# Altium footprint library USER_Lib.PcbLib: 109 footprints (part 4 of 7)
Each footprint in its own frame and in the unit in brackets; x right, y up, seen from the top. Pads: shape width x height; smd on the part's side, far side on the other; paste and mask are expansions set on the pad; w line width, h text height; cw(c..) or ccw(c..) is an arc to the next point about the centre after c.
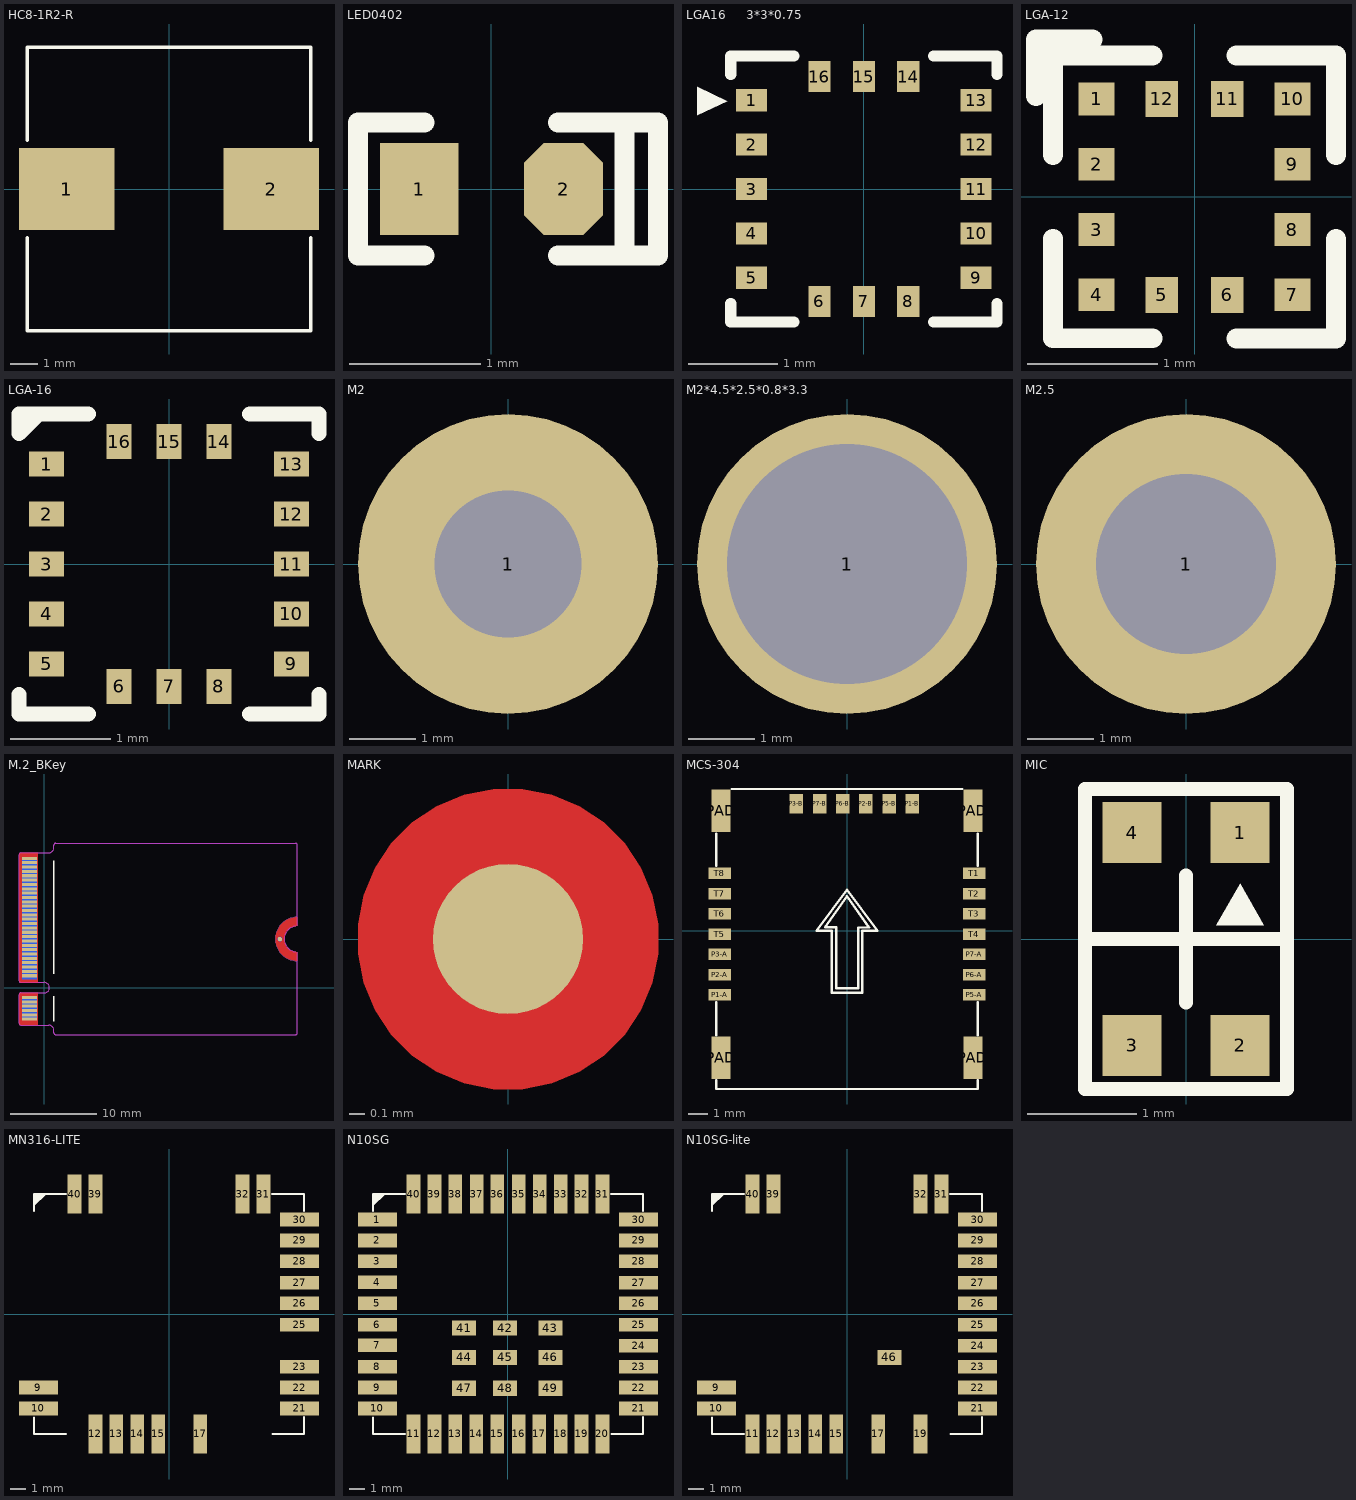
[diagram p3: the footprints below, top view; thin cyan lines are the x and y axes]

## HC8-1R2-R [mm] "1.2uH电感"
pads (2):
  rect 3.5x3 smd mask+0.102: 1(-3.75,0) 2(3.75,0)
Top Overlay:
  lines w0.127: -5.2,-1.778 -5.2,-5.2 0,-5.2 5.2,-5.2 5.2,-1.778 ; -5.2,1.778 -5.2,5.2 0,5.2 5.2,5.2 5.2,1.778
3D body "HC8-1R2-R.STEP": height 4, standoff 0, extent -5.45,-5.2 5.45,5.2

## IPEX 1代 [mm]

## LED0402 [mm] "0402贴片灯珠"
pads (2):
  rect 0.6x0.7 smd: 1(-0.55,0)
  oct 0.6x0.7 smd: 2(0.55,0)
Top Overlay:
  lines w0.152: -0.508,-0.508 -1.016,-0.508 -1.016,0.508 -0.508,0.508 ; 0.508,-0.508 1.27,-0.508 1.27,0.508 0.508,0.508 ; 1.016,-0.508 1.016,0.508
3D body "0402SMD_LED.STEP": height 0.45, standoff 0, extent -0.5,-0.25 0.5,0.25

## LGA16     3*3*0.75 [mm]
pads (16):
  rect 0.35x0.25 smd: 1(-1.265,1) 2(-1.265,0.5) 3(-1.265,0) 4(-1.265,-0.5) 5(-1.265,-1) 9(1.265,-1) 10(1.265,-0.5) 11(1.265,0) 12(1.265,0.5) 13(1.265,1)
  rect 0.25x0.35 smd: 6(-0.5,-1.265) 7(0,-1.265) 8(0.5,-1.265) 14(0.5,1.265) 15(0,1.265) 16(-0.5,1.265)
Top Overlay:
  region: -1.88,1.152 -1.537,0.991 -1.88,0.829
  lines w0.127: -1.5,-1.291 -1.5,-1.499 -0.787,-1.499 ; -1.5,1.291 -1.5,1.499 -0.787,1.499 ; 0.787,-1.499 1.5,-1.499 1.5,-1.291 ; 0.787,1.499 1.5,1.499 1.5,1.291
3D body "LGA16_3x3x0.75mm.STEP": height 0.75, standoff 0, extent -1.5,-1.5 1.5,1.5

## LGA-12 [mm] "KXTJ-1057"
pads (12):
  rect 0.275x0.25 smd: 1(-0.75,0.75) 2(-0.75,0.25) 3(-0.75,-0.25) 4(-0.75,-0.75) 7(0.75,-0.75) 8(0.75,-0.25) 9(0.75,0.25) 10(0.75,0.75)
  rect 0.25x0.275 smd: 5(-0.25,-0.75) 6(0.25,-0.75) 11(0.25,0.75) 12(-0.25,0.75)
Top Overlay:
  lines w0.152: -1.214,0.773 -1.214,1.205 -0.782,1.205 ; -1.084,-0.32 -1.084,-1.082 -0.322,-1.082 ; -1.082,0.322 -1.082,1.084 -0.32,1.084 ; 0.32,-1.084 1.082,-1.084 1.082,-0.322 ; 0.322,1.082 1.084,1.082 1.084,0.32
3D body "LGA-12.STEP": height 0.9, standoff 0, extent -1,-1 1,1

## LGA-16 [mm] "ICM20602"
pads (16):
  rect 0.35x0.25 smd: 1(-1.225,1) 2(-1.225,0.5) 3(-1.225,0) 4(-1.225,-0.5) 5(-1.225,-1) 9(1.225,-1) 10(1.225,-0.5) 11(1.225,0) 12(1.225,0.5) 13(1.225,1)
  rect 0.25x0.35 smd: 6(-0.5,-1.225) 7(0,-1.225) 8(0.5,-1.225) 14(0.5,1.225) 15(0,1.225) 16(-0.5,1.225)
Top Overlay:
  lines w0.152: -1.5,-1.306 -1.5,-1.5 -0.807,-1.5 ; -0.807,1.5 -1.5,1.5 ; 0.807,-1.5 1.5,-1.5 1.5,-1.306 ; 0.807,1.5 1.5,1.5 1.5,1.306 ; -1.5,1.5 -1.5,1.306 -1.306,1.5 -1.5,1.5
3D body "ICM20602.STEP": height 0.75, standoff 0, extent -1.5,-1.5 1.5,1.5

## M2 [mm]
pads (1):
  round 4.5 hole 2.2: 1(0,0)

## M2*4.5*2.5*0.8*3.3 [mm] "SMT螺母"
pads (1):
  round 4.5 hole 3.6: 1(0,0)
3D body "M2x4.5x2.5x0.8x3.STEP": height 2.5, standoff -0.8, extent -2.25,-2.25 2.25,2.25

## M2.5 [mm]
pads (1):
  round 4.5 hole 2.7: 1(0,0)

## M.2_BKey [mm]
pads (69):
  round 0.5 smd: 0(27.102,5.588)
  round 0.5 smd far side: 0(27.102,5.588)
  rect 1.7x0.35 smd: 1(-1.7,-3.625) 3(-1.7,-3.125) 5(-1.7,-2.625) 7(-1.7,-2.125) 9(-1.7,-1.625) 11(-1.7,-1.125) 21(-1.7,1.375) 23(-1.7,1.875) 25(-1.7,2.375) 27(-1.7,2.875) 29(-1.7,3.375) 31(-1.7,3.875) 33(-1.7,4.375) 35(-1.7,4.875) 37(-1.7,5.375) 39(-1.7,5.875) 41(-1.7,6.375) 43(-1.7,6.875) 45(-1.7,7.375) 47(-1.7,7.875) 49(-1.7,8.375) 51(-1.7,8.875) 53(-1.7,9.375) 55(-1.7,9.875) 57(-1.7,10.375) 59(-1.7,10.875) 61(-1.7,11.375) 63(-1.7,11.875) 65(-1.7,12.375) 67(-1.7,12.875) 69(-1.7,13.375) 71(-1.7,13.875) 73(-1.7,14.375) 75(-1.7,14.875)
  rect 1.7x0.35 smd far side: 2(-1.7,-3.376) 4(-1.7,-2.876) 6(-1.7,-2.376) 8(-1.7,-1.876) 10(-1.7,-1.376) 20(-1.7,1.125) 22(-1.7,1.625) 24(-1.7,2.125) 26(-1.7,2.624) 28(-1.7,3.124) 30(-1.7,3.624) 32(-1.7,4.124) 34(-1.7,4.624) 36(-1.7,5.124) 38(-1.7,5.624) 40(-1.7,6.124) 42(-1.7,6.624) 44(-1.7,7.124) 46(-1.7,7.624) 48(-1.7,8.124) 50(-1.7,8.624) 52(-1.7,9.124) 54(-1.7,9.624) 56(-1.7,10.124) 58(-1.7,10.624) 60(-1.7,11.124) 62(-1.7,11.624) 64(-1.7,12.124) 66(-1.7,12.624) 68(-1.7,13.124) 70(-1.7,13.624) 72(-1.7,14.124) 74(-1.7,14.624)
Top Layer:
  region: 29.1,3.1 28.854,3.1 28.371,3.196 27.916,3.385 27.506,3.658 27.158,4.006 26.885,4.416 26.696,4.871 26.6,5.354 26.6,5.846 26.696,6.329 26.885,6.784 27.158,7.194 27.506,7.542 27.916,7.815 28.371,8.004 28.854,8.1 29.1,8.1 29.1,7.1 28.953,7.093 28.665,7.035 28.393,6.923 28.148,6.76 27.94,6.552 27.777,6.307 27.665,6.035 27.607,5.747 27.607,5.453 27.665,5.165 27.777,4.893 27.94,4.648 28.148,4.44 28.393,4.277 28.665,4.165 28.953,4.107 29.1,4.1
  pour cut-out: -2.907,-4.1 -2.907,-4.141 -2.875,-4.217 -2.817,-4.275 -2.741,-4.307 -2.7,-4.307 -0.745,-4.307 -0.743,-4.307 -0.741,-4.306 -0.739,-4.304 -0.738,-4.301 -0.738,-4.3 -0.738,-0.6 -0.738,-0.599 -0.739,-0.596 -0.741,-0.594 -0.743,-0.593 -0.745,-0.593 -2.7,-0.593 -2.741,-0.593 -2.817,-0.625 -2.875,-0.683 -2.907,-0.759 -2.907,-0.8
  pour cut-out: -2.907,0.8 -2.907,0.759 -2.875,0.683 -2.817,0.625 -2.741,0.593 -2.7,0.593 -0.745,0.593 -0.743,0.593 -0.741,0.594 -0.739,0.596 -0.738,0.599 -0.738,0.6 -0.738,15.5 -0.738,15.501 -0.739,15.504 -0.741,15.506 -0.743,15.507 -0.745,15.507 -2.7,15.507 -2.741,15.507 -2.817,15.475 -2.875,15.417 -2.907,15.341 -2.907,15.3
Bottom Layer:
  pour cut-out: -2.907,-4.1 -2.907,-4.141 -2.875,-4.217 -2.817,-4.275 -2.741,-4.307 -2.7,-4.307 -0.745,-4.307 -0.743,-4.307 -0.741,-4.306 -0.739,-4.304 -0.738,-4.301 -0.738,-4.3 -0.738,-0.6 -0.738,-0.599 -0.739,-0.596 -0.741,-0.594 -0.743,-0.593 -0.745,-0.593 -2.7,-0.593 -2.741,-0.593 -2.817,-0.625 -2.875,-0.683 -2.907,-0.759 -2.907,-0.8
  pour cut-out: -2.907,0.8 -2.907,0.759 -2.875,0.683 -2.817,0.625 -2.741,0.593 -2.7,0.593 -0.745,0.593 -0.743,0.593 -0.741,0.594 -0.739,0.596 -0.738,0.599 -0.738,0.6 -0.738,15.5 -0.738,15.501 -0.739,15.504 -0.741,15.506 -0.743,15.507 -0.745,15.507 -2.7,15.507 -2.741,15.507 -2.817,15.475 -2.875,15.417 -2.907,15.341 -2.907,15.3
  region: 29.1,3.1 28.854,3.1 28.371,3.196 27.916,3.385 27.506,3.658 27.158,4.006 26.885,4.416 26.696,4.871 26.6,5.354 26.6,5.846 26.696,6.329 26.885,6.784 27.158,7.194 27.506,7.542 27.916,7.815 28.371,8.004 28.854,8.1 29.1,8.1 29.1,7.1 28.953,7.093 28.665,7.035 28.393,6.923 28.148,6.76 27.94,6.552 27.777,6.307 27.665,6.035 27.607,5.747 27.607,5.453 27.665,5.165 27.777,4.893 27.94,4.648 28.148,4.44 28.393,4.277 28.665,4.165 28.953,4.107 29.1,4.1
Top Overlay:
  lines w0.152: 1.1,-3.835 1.1,-0.965 ; 1.1,1.577 1.1,14.577
Bottom Overlay:
  lines w0.152: 1.1,-3.835 1.1,-0.965 ; 1.1,1.577 1.1,14.577
Top Solder:
  region: 29.1,3.1 28.854,3.1 28.371,3.196 27.916,3.385 27.506,3.658 27.158,4.006 26.885,4.416 26.696,4.871 26.6,5.354 26.6,5.846 26.696,6.329 26.885,6.784 27.158,7.194 27.506,7.542 27.916,7.815 28.371,8.004 28.854,8.1 29.1,8.1 29.1,7.1 28.953,7.093 28.665,7.035 28.393,6.923 28.148,6.76 27.94,6.552 27.777,6.307 27.665,6.035 27.607,5.747 27.607,5.453 27.665,5.165 27.777,4.893 27.94,4.648 28.148,4.44 28.393,4.277 28.665,4.165 28.953,4.107 29.1,4.1
  region: -2.907,0.8 -2.907,0.759 -2.875,0.683 -2.817,0.625 -2.741,0.593 -2.7,0.593 -0.745,0.593 -0.743,0.593 -0.741,0.594 -0.739,0.596 -0.738,0.599 -0.738,0.6 -0.738,15.5 -0.738,15.501 -0.739,15.504 -0.741,15.506 -0.743,15.507 -0.745,15.507 -2.7,15.507 -2.741,15.507 -2.817,15.475 -2.875,15.417 -2.907,15.341 -2.907,15.3
  region: -2.907,-4.1 -2.907,-4.141 -2.875,-4.217 -2.817,-4.275 -2.741,-4.307 -2.7,-4.307 -0.745,-4.307 -0.743,-4.307 -0.741,-4.306 -0.739,-4.304 -0.738,-4.301 -0.738,-4.3 -0.738,-0.6 -0.738,-0.599 -0.739,-0.596 -0.741,-0.594 -0.743,-0.593 -0.745,-0.593 -2.7,-0.593 -2.741,-0.593 -2.817,-0.625 -2.875,-0.683 -2.907,-0.759 -2.907,-0.8
Bottom Solder:
  region: 29.1,3.1 28.854,3.1 28.371,3.196 27.916,3.385 27.506,3.658 27.158,4.006 26.885,4.416 26.696,4.871 26.6,5.354 26.6,5.846 26.696,6.329 26.885,6.784 27.158,7.194 27.506,7.542 27.916,7.815 28.371,8.004 28.854,8.1 29.1,8.1 29.1,7.1 28.953,7.093 28.665,7.035 28.393,6.923 28.148,6.76 27.94,6.552 27.777,6.307 27.665,6.035 27.607,5.747 27.607,5.453 27.665,5.165 27.777,4.893 27.94,4.648 28.148,4.44 28.393,4.277 28.665,4.165 28.953,4.107 29.1,4.1
  region: -2.907,0.8 -2.907,0.759 -2.875,0.683 -2.817,0.625 -2.741,0.593 -2.7,0.593 -0.745,0.593 -0.743,0.593 -0.741,0.594 -0.739,0.596 -0.738,0.599 -0.738,0.6 -0.738,15.5 -0.738,15.501 -0.739,15.504 -0.741,15.506 -0.743,15.507 -0.745,15.507 -2.7,15.507 -2.741,15.507 -2.817,15.475 -2.875,15.417 -2.907,15.341 -2.907,15.3
  region: -2.907,-4.1 -2.907,-4.141 -2.875,-4.217 -2.817,-4.275 -2.741,-4.307 -2.7,-4.307 -0.745,-4.307 -0.743,-4.307 -0.741,-4.306 -0.739,-4.304 -0.738,-4.301 -0.738,-4.3 -0.738,-0.6 -0.738,-0.599 -0.739,-0.596 -0.741,-0.594 -0.743,-0.593 -0.745,-0.593 -2.7,-0.593 -2.741,-0.593 -2.817,-0.625 -2.875,-0.683 -2.907,-0.759 -2.907,-0.8
Keep-Out Layer:
  lines w0.013: -2.9,-4.1 ccw(c-2.7,-4.1) -2.7,-4.3 0.5,-4.3 cw(c0.5,-4.9) 1.1,-4.9 1.1,-5.2 ccw(c1.3,-5.2) 1.3,-5.4 21.9,-5.4 28.9,-5.4 ccw(c28.9,-5.2) 29.1,-5.2 29.1,3.1 29.1,4.1 cw(c29.1,5.6) 29.1,7.1 29.1,8.1 29.1,16.4 ccw(c28.9,16.4) 28.9,16.6 21.9,16.6 1.3,16.6 ccw(c1.3,16.4) 1.1,16.4 1.1,16.1 cw(c0.5,16.1) 0.5,15.5 -2.7,15.5 ccw(c-2.7,15.3) -2.9,15.3 -2.9,0.8 ccw(c-2.7,0.8) -2.7,0.6 0,0.6 cw(c0,0) 0,-0.6 -2.7,-0.6 ccw(c-2.7,-0.8) -2.9,-0.8 -2.9,-4.1
Mechanical 2:
  lines w0.013: 29.1,3.1 cw(c29.1,5.6) 29.1,8.1 ; 29.1,3.1 29.1,4.1 cw(c29.1,5.6) 29.1,7.1 29.1,8.1 ; 29.1,3.1 29.1,-5.2 cw(c28.9,-5.2) 28.9,-5.4 21.9,-5.4 1.3,-5.4 cw(c1.3,-5.2) 1.1,-5.2 1.1,-4.9 ccw(c0.5,-4.9) 0.5,-4.3 -2.7,-4.3 cw(c-2.7,-4.1) -2.9,-4.1 -2.9,-0.8 cw(c-2.7,-0.8) -2.7,-0.6 0,-0.6 ccw(c0,0) 0,0.6 -2.7,0.6 cw(c-2.7,0.8) -2.9,0.8 -2.9,15.3 cw(c-2.7,15.3) -2.7,15.5 0.5,15.5 ccw(c0.5,16.1) 1.1,16.1 1.1,16.4 cw(c1.3,16.4) 1.3,16.6 21.9,16.6 28.9,16.6 cw(c28.9,16.4) 29.1,16.4 29.1,8.1

## MARK [mm]
pads (1):
  round 1 smd mask+0.102: ""(0,0)
Top Layer:
  pour cut-out: 0,-1 -0.098,-1 -0.292,-0.962 -0.474,-0.886 -0.637,-0.777 -0.777,-0.637 -0.886,-0.474 -0.962,-0.292 -1,-0.098 -1,0 -1,0.098 -0.962,0.292 -0.886,0.474 -0.777,0.637 -0.637,0.777 -0.474,0.886 -0.292,0.962 -0.098,1 0,1 0.098,1 0.292,0.962 0.474,0.886 0.637,0.777 0.777,0.637 0.886,0.474 0.962,0.292 1,0.098 1,0 1,-0.098 0.962,-0.292 0.886,-0.474 0.777,-0.637 0.637,-0.777 0.474,-0.886 0.292,-0.962 0.098,-1
Top Solder:
  region: 0,-1 -0.098,-1 -0.292,-0.962 -0.474,-0.886 -0.637,-0.777 -0.777,-0.637 -0.886,-0.474 -0.962,-0.292 -1,-0.098 -1,0 -1,0.098 -0.962,0.292 -0.886,0.474 -0.777,0.637 -0.637,0.777 -0.474,0.886 -0.292,0.962 -0.098,1 0,1 0.098,1 0.292,0.962 0.474,0.886 0.637,0.777 0.777,0.637 0.886,0.474 0.962,0.292 1,0.098 1,0 1,-0.098 0.962,-0.292 0.886,-0.474 0.777,-0.637 0.637,-0.777 0.474,-0.886 0.292,-0.962 0.098,-1

## MCS-304 [mm] "双层卡座"
pads (24):
  rect 1.15x0.6 smd: P1-A(-6.6,-3.325) P2-A(-6.6,-2.275) P3-A(-6.6,-1.225) P5-A(6.6,-3.325) P6-A(6.6,-2.275) P7-A(6.6,-1.225) T1(6.6,2.975) T2(6.6,1.925) T3(6.6,0.875) T4(6.6,-0.175) T5(-6.6,-0.175) T6(-6.6,0.875) T7(-6.6,1.925) T8(-6.6,2.975)
  rect 0.7x1 smd: P1-B(3.38,6.585) P2-B(0.98,6.585) P3-B(-2.62,6.585) P5-B(2.18,6.585) P6-B(-0.22,6.585) P7-B(-1.42,6.585)
  rect 1x2.2 smd: PAD(-6.53,-6.585) PAD(-6.53,6.215) PAD(6.53,-6.585) PAD(6.53,6.215)
Top Overlay:
  lines w0.127: -6.78,-7.749 -6.78,-8.204 6.78,-8.204 6.78,-7.75 ; -6.78,-5.416 -6.781,-3.696 ; -6.78,3.358 -6.78,5.036 ; -5.967,7.347 5.971,7.347 ; 6.78,-5.416 6.781,-3.696 ; 6.78,3.358 6.78,5.036 ; -1.575,0 0,2.116 1.575,0 0.787,0 0.787,-3.212 -0.787,-3.212 -0.787,0 -1.575,0 ; -1.141,0.178 -0.001,1.78 1.145,0.168 0.584,0.168 0.584,-2.972 -0.559,-2.972 -0.559,0.178 -1.141,0.178

## MIC [mm] "上进音模拟麦克风"
pads (4):
  rect 0.54x0.56 smd mask+0.102: 1(0.495,0.975) 2(0.495,-0.975) 3(-0.495,-0.975) 4(-0.495,0.975)
Top Overlay:
  region: 0.279,0.127 0.495,0.508 0.711,0.127
  lines w0.127: -0.864,0 0,0 ; 0,-0.584 0,0 ; 0,0.584 0,0 ; 0.864,0 0,0 ; -0.925,-1.375 0.925,-1.375 0.925,-1.375 0.925,1.375 -0.925,1.375 -0.925,-1.375 ; -0.925,-1.375 -0.925,-1.375
3D body "MIC.STEP": height 0.95, standoff 0, extent -0.925,-1.375 0.925,1.375

## MN316-LITE [mm] "去除没有用到的引脚"
pads (20):
  rect 2.6x0.9 smd: 9(-8.7,-4.9) 10(-8.7,-6.3) 21(8.7,-6.3) 22(8.7,-4.9) 23(8.7,-3.5) 25(8.7,-0.7) 26(8.7,0.7) 27(8.7,2.1) 28(8.7,3.5) 29(8.7,4.9) 30(8.7,6.3)
  rect 0.9x2.6 smd: 12(-4.9,-8) 13(-3.5,-8) 14(-2.1,-8) 15(-0.7,-8) 17(2.1,-8) 31(6.3,8) 32(4.9,8) 39(-4.9,8) 40(-6.3,8)
Top Overlay:
  region: -9.003,7.18 -9.003,8 -8.183,8
  lines w0.152: -9.003,6.875 -9.003,8 -6.889,8 ; -9.001,-6.893 -9.001,-8 -6.87,-8 ; 6.864,8 8.999,8 8.999,6.87 ; 6.894,-7.998 9,-7.998 9,-6.885
3D body "N10SG.STEP": height 2.4, standoff 0, extent -9,-8 9,8

## N10SG [mm] "NB-IOT  GNSS"
pads (49):
  rect 2.6x0.9 smd: 1(-8.7,6.3) 2(-8.7,4.9) 3(-8.7,3.5) 4(-8.7,2.1) 5(-8.7,0.7) 6(-8.7,-0.7) 7(-8.7,-2.1) 8(-8.7,-3.5) 9(-8.7,-4.9) 10(-8.7,-6.3) 21(8.7,-6.3) 22(8.7,-4.9) 23(8.7,-3.5) 24(8.7,-2.1) 25(8.7,-0.7) 26(8.7,0.7) 27(8.7,2.1) 28(8.7,3.5) 29(8.7,4.9) 30(8.7,6.3)
  rect 0.9x2.6 smd: 11(-6.3,-8) 12(-4.9,-8) 13(-3.5,-8) 14(-2.1,-8) 15(-0.7,-8) 16(0.7,-8) 17(2.1,-8) 18(3.5,-8) 19(4.9,-8) 20(6.3,-8) 31(6.3,8) 32(4.9,8) 33(3.5,8) 34(2.1,8) 35(0.7,8) 36(-0.7,8) 37(-2.1,8) 38(-3.5,8) 39(-4.9,8) 40(-6.3,8)
  rect 1.6x1 smd: 41(-2.93,-0.95) 42(-0.2,-0.95) 43(2.83,-0.95) 44(-2.93,-2.9) 45(-0.2,-2.9) 46(2.83,-2.9) 47(-2.93,-4.95) 48(-0.2,-4.95) 49(2.83,-4.95)
Top Overlay:
  region: -9.003,7.18 -9.003,8 -8.183,8
  lines w0.152: -9.003,6.875 -9.003,8 -6.889,8 ; -9.001,-6.893 -9.001,-8 -6.87,-8 ; 6.864,8 8.999,8 8.999,6.87 ; 6.894,-7.998 9,-7.998 9,-6.885
3D body "N10SG.STEP": height 2.4, standoff 0, extent -9,-8 9,8

## N10SG-lite [mm] "去除没有用到的引脚"
pads (24):
  rect 2.6x0.9 smd: 9(-8.7,-4.9) 10(-8.7,-6.3) 21(8.7,-6.3) 22(8.7,-4.9) 23(8.7,-3.5) 24(8.7,-2.1) 25(8.7,-0.7) 26(8.7,0.7) 27(8.7,2.1) 28(8.7,3.5) 29(8.7,4.9) 30(8.7,6.3)
  rect 0.9x2.6 smd: 11(-6.3,-8) 12(-4.9,-8) 13(-3.5,-8) 14(-2.1,-8) 15(-0.7,-8) 17(2.1,-8) 19(4.9,-8) 31(6.3,8) 32(4.9,8) 39(-4.9,8) 40(-6.3,8)
  rect 1.6x1 smd: 46(2.83,-2.9)
Top Overlay:
  region: -9.003,7.18 -9.003,8 -8.183,8
  lines w0.152: -9.003,6.875 -9.003,8 -6.889,8 ; -9.001,-6.893 -9.001,-8 -6.87,-8 ; 6.864,8 8.999,8 8.999,6.87 ; 6.894,-7.998 9,-7.998 9,-6.885
3D body "N10SG.STEP": height 2.4, standoff 0, extent -9,-8 9,8